# Altium footprint library North POLE.PcbLib: 419 footprints (part 12 of 27)
Each footprint in its own frame and in the unit in brackets; x right, y up, seen from the top. Pads: shape width x height; smd on the part's side, far side on the other; paste and mask are expansions set on the pad; w line width, h text height; cw(c..) or ccw(c..) is an arc to the next point about the centre after c.
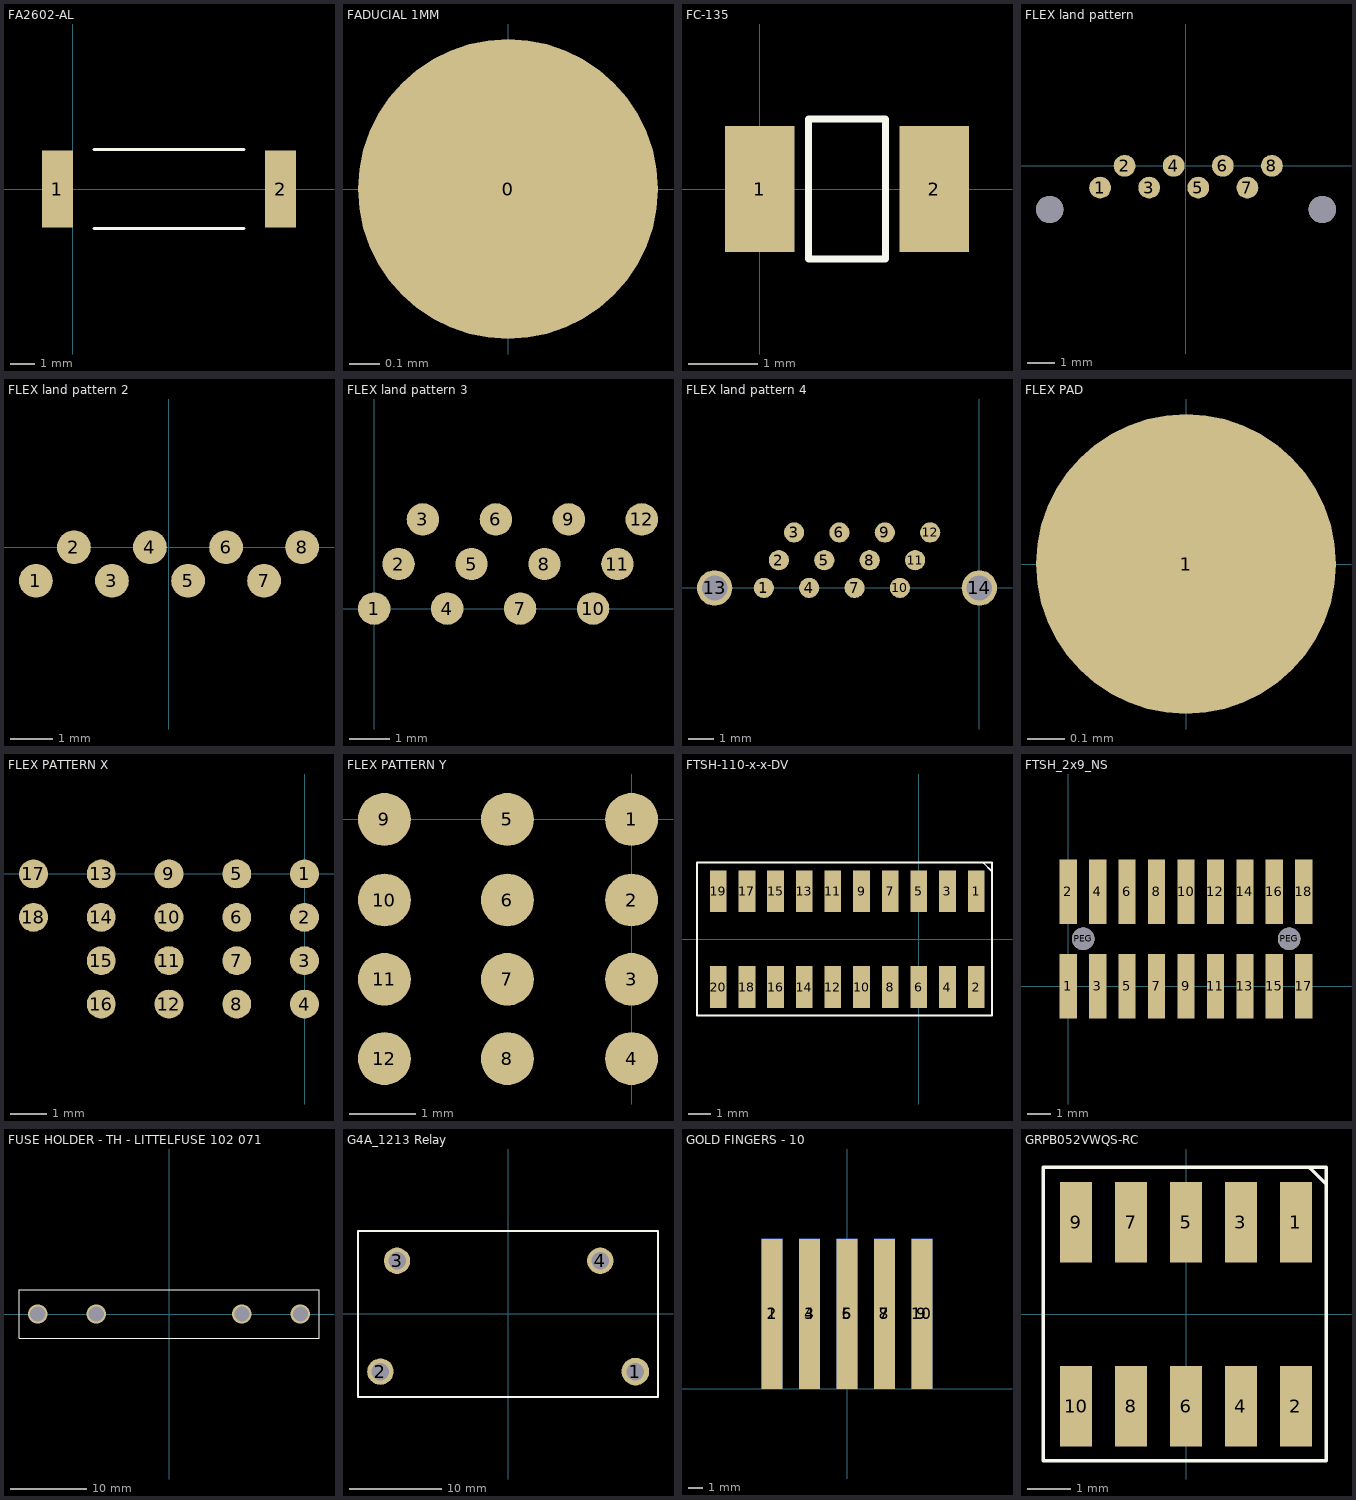
[diagram p11: the footprints below, top view; thin cyan lines are the x and y axes]

## FA2602-AL [mil] "RFID 5.5kHz transponder coil"
height 102.36
pads (2):
  rect 51x126 smd: 1(-25,0) 2(340,0)
Top Overlay:
  lines w5: 35,-65 280,-65 ; 35,65 280,65
3D body: height 102, standoff 0, extent -30,-65 340,65
3D body: height 102, standoff 0, extent -30,-65 345,65

## FADUCIAL 1MM [mm]
pads (1):
  round 1 smd mask+0.5: 0(0,0)

## FC-135 [mm]
pads (2):
  rect 1x1.8 smd: 1(0,0) 2(2.5,0)
Top Overlay:
  lines w0.1: 0.7,-1 1.8,-1 1.8,1 0.7,1 0.7,-1
3D body: height 0.8, standoff 0, extent -0.33,-0.749 2.87,0.749

## FLEX land pattern [mm]
pads (10):
  round 0.8 smd mask+0.08: 1(-3.15,-0.794) 2(-2.25,0.006) 3(-1.35,-0.794) 4(-0.45,0.006) 5(0.45,-0.794) 6(1.35,0.006) 7(2.25,-0.794) 8(3.15,0.006)
  round 1 hole 1 mask+0.02: ""(-5,-1.594) ""(5,-1.594)

## FLEX land pattern 2 [mm]
pads (8):
  round 0.8 smd mask+0.08: 1(-3.15,-0.794) 2(-2.25,0) 3(-1.35,-0.794) 4(-0.45,0) 5(0.45,-0.794) 6(1.35,0) 7(2.25,-0.794) 8(3.15,0)

## FLEX land pattern 3 [mm]
pads (12):
  round 0.8 smd mask+0.08: 1(0,0) 2(0.6,1.1) 3(1.2,2.2) 4(1.8,0) 5(2.4,1.1) 6(3,2.2) 7(3.6,0) 8(4.2,1.1) 9(4.8,2.2) 10(5.4,0) 11(6,1.1) 12(6.6,2.2)

## FLEX land pattern 4 [mm]
pads (14):
  round 0.8 smd mask+0.08: 1(-8.55,0) 2(-7.95,1.1) 3(-7.35,2.2) 4(-6.75,0) 5(-6.15,1.1) 6(-5.55,2.2) 7(-4.95,0) 8(-4.35,1.1) 9(-3.75,2.2) 10(-3.15,0) 11(-2.55,1.1) 12(-1.95,2.2)
  round 1.4 hole 1 mask+0.02: 13(-10.5,0) 14(0,0)

## FLEX PAD [mm]
pads (1):
  round 0.8 smd mask+0.08: 1(0,0)

## FLEX PATTERN X [mm]
pads (18):
  round 0.8 smd mask+0.08: 1(0,0) 2(0,-1.2) 3(0,-2.4) 4(0,-3.6) 5(-1.873,0) 6(-1.873,-1.2) 7(-1.873,-2.4) 8(-1.873,-3.6) 9(-3.746,0) 10(-3.746,-1.2) 11(-3.746,-2.4) 12(-3.746,-3.6) 13(-5.619,0) 14(-5.619,-1.2) 15(-5.619,-2.4) 16(-5.619,-3.6) 17(-7.492,0) 18(-7.492,-1.2)

## FLEX PATTERN Y [mm]
pads (12):
  round 0.8 smd mask+0.08: 1(0,0) 2(0,-1.22) 3(0,-2.42) 4(0,-3.62) 5(-1.88,0) 6(-1.88,-1.22) 7(-1.88,-2.42) 8(-1.88,-3.62) 9(-3.74,0) 10(-3.74,-1.22) 11(-3.74,-2.42) 12(-3.74,-3.62)

## FTSH-110-x-x-DV [mm] "20 pin surfave mount connector use for jtag"
height 5.97
pads (20):
  rect 0.74x1.85 smd mask+0.08: 1(2.54,2.125) 2(2.54,-2.125) 3(1.27,2.125) 4(1.27,-2.125) 5(0,2.125) 6(0,-2.125) 7(-1.27,2.125) 8(-1.27,-2.125) 9(-2.54,2.125) 10(-2.54,-2.125) 11(-3.81,2.125) 12(-3.81,-2.125) 13(-5.08,2.125) 14(-5.08,-2.125) 15(-6.35,2.125) 16(-6.35,-2.125) 17(-7.62,2.125) 18(-7.62,-2.125) 19(-8.89,2.125) 20(-8.89,-2.125)
Top Overlay:
  lines w0.076: 2.859,3.375 2.868,3.375 3.24,3.003 ; -9.832,-3.384 -9.832,3.397 -3.295,3.397 3.242,3.397 3.242,-3.384 -3.295,-3.384 -9.832,-3.384
3D body: height 6.21, standoff 0.09, extent -9.532,-2.919 3.168,2.923

## FTSH_2x9_NS [mm]
pads (20):
  rect 0.74x2.79 smd: 1(0,0) 2(0,4.07) 3(1.27,0) 4(1.27,4.07) 5(2.54,0) 6(2.54,4.07) 7(3.81,0) 8(3.81,4.07) 9(5.08,0) 10(5.08,4.07) 11(6.35,0) 12(6.35,4.07) 13(7.62,0) 14(7.62,4.07) 15(8.89,0) 16(8.89,4.07) 17(10.16,0) 18(10.16,4.07)
  round 0.97 hole 0.97 unplated: PEG(0.64,2.04) PEG(9.53,2.04)
3D body: height 4.42, standoff -2.29, extent -0.635,0.316 10.795,3.745

## FUSE HOLDER - TH - LITTELFUSE 102 071 [mm]
via 9.487,0 diameter 2.54 hole 1.981
via -9.487,0 diameter 2.54 hole 1.981
via -17.107,0 diameter 2.54 hole 1.981
via 17.107,0 diameter 2.54 hole 1.981
Top Overlay:
  lines w0.127: -19.558,3.175 19.533,3.175 19.533,-3.175 -19.547,-3.175 -19.547,3.175

## G4A_1213 Relay [mm] "Omron G4A-1A-E DC12 relay"
pads (4):
  round 3 hole 1.9: 1(13.775,-6.25)
  round 2.85 hole 1.9: 2(-13.825,-6.25) 3(-12.025,5.75) 4(9.975,5.75)
Top Overlay:
  lines w0.254: -16.25,-9 -16.25,8.975 16.225,8.975 16.225,-9 13.775,-9 -16.25,-9
3D body: height 34.01, standoff -2.99, extent -15.25,-8 15.25,8

## GOLD FINGERS - 10 [mil]
pads (10):
  rect 55x400 smd mask+3.15: 1(-200,200) 3(-100,200) 5(0,200) 7(100,200) 9(200,200)
  rect 55x400 smd far side mask+3.15: 2(-200,200) 4(-100,200) 6(0,200) 8(100,200) 10(200,200)

## GRPB052VWQS-RC [mm]
pads (10):
  rect 0.74x1.85 smd mask+0.08: 1(2.54,2.125) 2(2.54,-2.125) 3(1.27,2.125) 4(1.27,-2.125) 5(0,2.125) 6(0,-2.125) 7(-1.27,2.125) 8(-1.27,-2.125) 9(-2.54,2.125) 10(-2.54,-2.125)
Top Overlay:
  lines w0.076: 2.859,3.375 2.868,3.375 3.24,3.003 ; -3.295,-3.384 3.242,-3.384 3.242,3.397 -3.295,3.397 -3.295,-3.384
3D body: height 6.06, standoff 0.09, extent -3.175,-2.921 3.175,2.921